# Altium footprint library DipComponent.PcbLib: 303 footprints (part 3 of 19)
Each footprint in its own frame and in the unit in brackets; x right, y up, seen from the top. Pads: shape width x height; smd on the part's side, far side on the other; paste and mask are expansions set on the pad; w line width, h text height; cw(c..) or ccw(c..) is an arc to the next point about the centre after c.
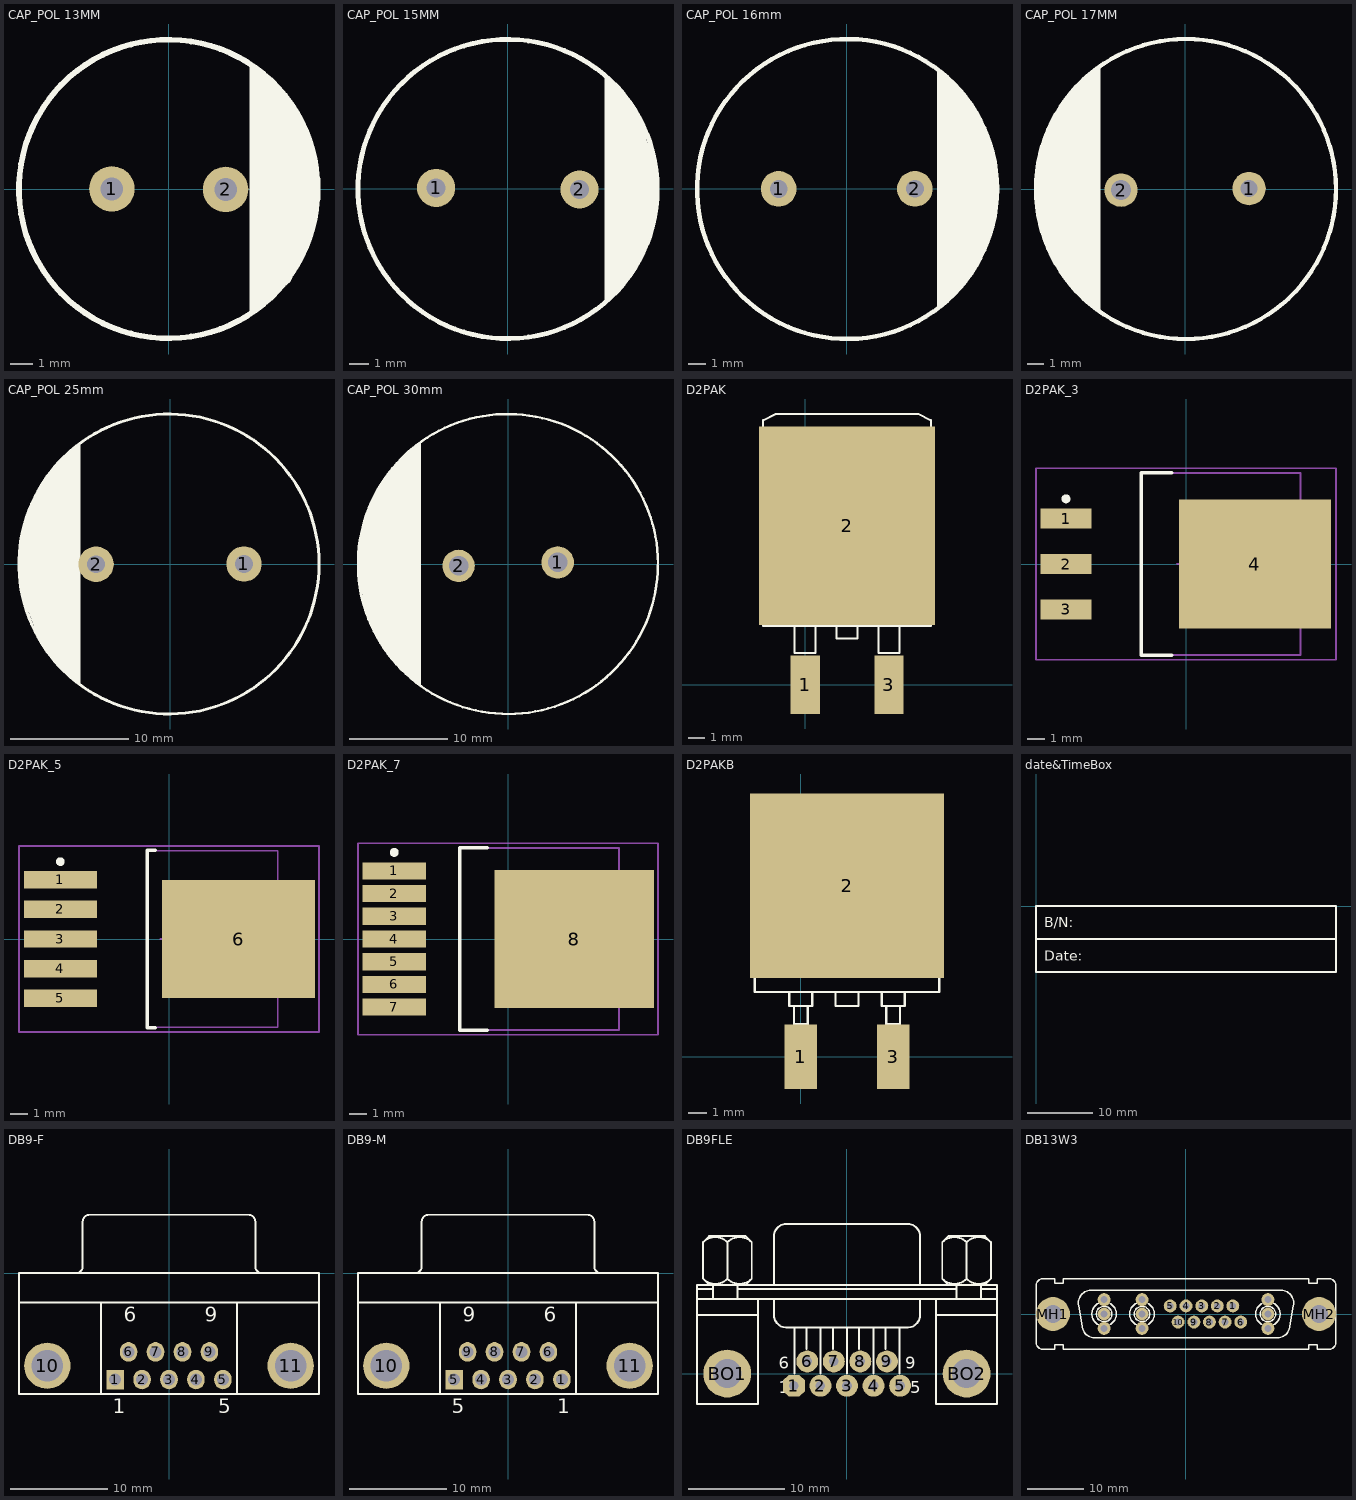
[diagram p2: the footprints below, top view; thin cyan lines are the x and y axes]

## CAP_POL 13MM [mm]
pads (2):
  round 2 hole 1: 1(-2.501,0.013) 2(2.501,-0.013)
Top Overlay:
  circle w0.254: c-0.017,0.007 r6.564
  region: 3.556,-5.588 3.556,5.588 4.572,4.826 5.842,3.048 6.604,0.508 6.35,-1.778 5.334,-4.064 3.81,-5.334
3D body "User Library-Capacitor, Al El, Thru Mt, 2200uF, 25V - CDE #SEK222M025ST.STEP": height 25.4, standoff -28.75, extent -6.6,-6.611 6.6,6.589

## CAP_POL 15MM [mm]
pads (2):
  round 2 hole 1: 1(-3.756,0.041) 2(3.756,-0.041)
Top Overlay:
  circle w0.254: c-0.009,-0.018 r7.845
  region: 5.08,5.842 6.604,4.318 7.62,1.524 7.874,-0.508 7.366,-2.54 6.858,-3.81 5.334,-5.842 5.08,-6.096
3D body "User Library-Cap16x25.STEP": height 25.5, standoff -18.5, extent -7.923,-7.921 8.077,8.079

## CAP_POL 16mm [mm]
pads (2):
  round 2 hole 1: 1(-3.821,-0.001) 2(3.821,0.001)
Top Overlay:
  circle w0.254: c0.011,-0.01 r8.416
  region: 5.08,6.858 5.08,-6.604 6.604,-5.334 7.62,-3.81 8.382,-1.016 8.382,1.524 7.62,3.81 6.35,5.588
3D body "User Library-CE_R300_D650_H1000.STEP": height 26.4, standoff -2.5, extent -8.231,-8.246 8.252,8.215

## CAP_POL 17MM [mm]
pads (2):
  round 2 hole 1: 1(3.83,0.047)
  round 2 hole 1.2: 2(-3.83,-0.047)
Top Overlay:
  circle w0.254: c0.057,0.021 r8.972
  region: -5.08,-7.366 -5.08,7.366 -6.858,5.842 -8.382,3.048 -8.89,0.762 -8.89,-1.016 -8.382,-3.302 -7.112,-5.334
3D body "User Library-Body_R300_D720_H620.STEP": height 16, standoff -2, extent -9.096,-8.931 8.904,9.032

## CAP_POL 25mm [mm]
pads (2):
  round 3 hole 1.5: 1(6.261,0.013) 2(-6.261,-0.013)
Top Overlay:
  circle w0.254: c-0.088,0.01 r12.702
  region: -7.62,-10.16 -7.62,10.16 -9.652,8.382 -11.684,5.334 -12.7,2.032 -12.7,-0.762 -12.446,-2.794 -11.176,-6.096 -9.906,-8.128 -8.382,-9.652
3D body "User Library-Cap 25x50.STEP": height 52, standoff -17, extent -12.506,-12.534 12.494,12.466

## CAP_POL 30mm [mm]
pads (2):
  round 3.3 hole 2: 1(5.047,0.175) 2(-5.047,-0.175)
Top Overlay:
  region: -8.89,12.446 -8.89,-12.446 -10.922,-10.668 -12.954,-8.128 -14.478,-5.08 -15.24,-1.016 -15.24,1.778 -14.224,5.842 -12.107,9.37 -10.245,11.543
  lines w0.254: 15.267,-0.132 cw(c-0.017,0.013) 15.267,0.097
3D body "User Library-Assy_CE_R400_D1200_H1450.STEP": height 36.83, standoff -6.89, extent -15.1,-15.193 15.38,15.28

## D2PAK [mil]
pads (3):
  rect 70x140 smd: 1(0,0) 3(200,0)
  rect 420x472.44 smd: 2(99.91,378.74)
Top Overlay:
  lines w5: -25,140 -25,75 25,75 25,140 ; 75,140 75,110 125,110 125,140 ; 175,140 175,75 225,75 225,140 ; -100,140 -100,600 ; -100,140 300,140 ; -100,140 -90,150 ; -100,600 -100,630 -70,645 270,645 300,630 300,600 ; -100,600 300,600 ; -100,600 -90,575 ; -90,150 -90,575 ; -90,150 290,150 ; -90,575 290,575 ; 290,150 290,575 ; 290,150 300,140 ; 290,575 300,600 ; 300,140 300,600
3D body "D2PAK.STEP": height 184.65, standoff -2.52, extent -100,-9.78 300,555.57

## D2PAK_3 [mm] "D2-PAK, 4-Pads, Body 8.9x10.2mm (max), IPC Medium Density"
height 4.5
pads (4):
  rect 2.85x1.1 smd: 1(-6.7,2.54) 2(-6.7,0) 3(-6.7,-2.54)
  rect 8.5x7.2 smd: 4(3.85,0)
Top Overlay:
  circle w0.25: c-6.7,3.64 r0.125
  lines w0.2: -0.8,-5.1 -2.5,-5.1 -2.5,5.1 -0.8,5.1
Mechanical 13:
  lines w0.1: -2.5,-5.075 6.39,-5.075 6.39,5.075 -2.5,5.075 -2.5,-5.075
Mechanical 15:
  lines w0.1: -0.5,0 0.5,0 ; 0,-0.5 0,0.5 ; -8.375,-5.35 8.375,-5.35 8.375,5.35 -8.375,5.35 -8.375,-5.35
3D body "SW3dPS-TO263-3.STEP": height 4.78, standoff -0.02, extent -7.835,-4.996 7.835,5.004

## D2PAK_5 [mm] "D2-PAK, 6-Pads, Body 7.5x10.2mm (max), IPC Medium Density"
height 4.5
pads (6):
  rect 4.2x1 smd: 1(-6.25,3.4) 2(-6.25,1.7) 3(-6.25,0) 4(-6.25,-1.7) 5(-6.25,-3.4)
  rect 8.8x6.8 smd: 6(4,0)
Top Overlay:
  circle w0.25: c-6.25,4.45 r0.125
  lines w0.2: -0.8,-5.1 -1.25,-5.1 -1.25,5.1 -0.8,5.1
Mechanical 13:
  lines w0.1: -1.25,-5.075 -1.25,5.075 6.25,5.075 6.25,-5.075 -1.25,-5.075
Mechanical 15:
  lines w0.1: -0.5,0 0.5,0 ; 0,-0.5 0,0.5 ; -8.625,-5.35 -8.625,5.35 8.625,5.35 8.625,-5.35 -8.625,-5.35
3D body "SW3dPS-TO263-5.STEP": height 4.78, standoff -0.02, extent -7.745,-5.029 7.925,4.971

## D2PAK_7 [mm] "D2-PAK, 7-Pads, Body 8.9x10.2mm (max), IPC Medium Density"
height 4.5
pads (8):
  rect 3.55x0.95 smd: 1(-6.35,3.81) 2(-6.35,2.54) 3(-6.35,1.27) 4(-6.35,0) 5(-6.35,-1.27) 6(-6.35,-2.54) 7(-6.35,-3.81)
  rect 8.9x7.7 smd: 8(3.7,0)
Top Overlay:
  circle w0.25: c-6.35,4.835 r0.125
  lines w0.2: -1.15,-5.1 -2.7,-5.1 -2.7,5.1 -1.15,5.1
Mechanical 13:
  lines w0.1: -2.7,-5.075 6.19,-5.075 6.19,5.075 -2.7,5.075 -2.7,-5.075
Mechanical 15:
  lines w0.1: -0.5,0 0.5,0 ; 0,-0.5 0,0.5 ; -8.375,-5.35 8.375,-5.35 8.375,5.35 -8.375,5.35 -8.375,-5.35
3D body "SW3dPS-TO263-7.STEP": height 4.56, standoff -0.01, extent -7.005,-5.105 7.361,5.055

## D2PAKB [mil]
pads (3):
  rect 70x140 smd: 1(0,0) 3(200,0)
  rect 420x400 smd: 2(100,370)
Top Overlay:
  lines w5: -25,140 -25,110 25,110 25,140 ; -15,110 -15,70 15,70 15,110 ; 75,140 75,110 125,110 125,140 ; 175,140 175,110 225,110 225,140 ; 185,110 185,70 215,70 215,110 ; -100,140 300,140 300,520 300,550 270,565 -70,565 -100,550 -100,520 -100,140

## date&TimeBox [mil]
Top Overlay:
  lines w10: 0,-196.85 1791.34,-196.85 ; 0,-393.7 1791.34,-393.7 1791.34,0 0,0 0,-393.7
  text "Date:" at 49,-326 h60
  text "B/N:" at 49,-126 h60

## DB9-F [mm] "Connector; D Subminiature; 9 Position; Right Angle; Pitch 1.385 mm"
height 12.75
pads (11):
  rect 1.8x2 hole 1.2: 1(-5.54,-10.92)
  oval 1.8x2 hole 1.2: 2(-2.77,-10.92) 3(0,-10.92) 4(2.77,-10.92) 5(5.54,-10.92) 6(-4.155,-8.08) 7(-1.385,-8.08) 8(1.385,-8.08) 9(4.155,-8.08)
  round 4.76 hole 3.26: 10(-12.495,-9.5) 11(12.495,-9.5)
Top Overlay:
  lines w0.2: -15.4,-3 15.4,-3 ; -9.56,0.005 ccw(c-9.56,0.7) -8.865,0.7 -8.865,5.3 ; -8.86,5.305 cw(c-8.165,5.305) -8.165,6 8.165,6 cw(c8.165,5.305) 8.86,5.305 ; -7,-12.4 -7,-3 ; 7,-12.4 7,-3 ; 8.865,5.3 8.865,0.7 ccw(c9.56,0.7) 9.56,0.005 ; -15.4,-12.4 -15.4,0 15.4,0 15.4,-12.4 -15.4,-12.4
  text "1" at -5.79,-14.375 h1.5
  text "5" at 5.04,-14.375 h1.5
  text "9" at 3.655,-4.975 h1.5
  text "6" at -4.655,-4.975 h1.5
3D body "DB9-f.step": height 12.57, standoff -4.3, extent -15.456,-12.424 15.354,5.876

## DB9-M [mm] "Connector; D Subminiature; 9 Position; Right Angle; Pitch 1.385 mm"
height 12.75
pads (11):
  oval 1.8x2 hole 1.2: 1(5.54,-10.92) 2(2.77,-10.92) 3(0,-10.92) 4(-2.77,-10.92) 6(4.155,-8.08) 7(1.385,-8.08) 8(-1.385,-8.08) 9(-4.155,-8.08)
  rect 1.8x2 hole 1.2: 5(-5.54,-10.92)
  round 4.76 hole 3.26: 10(-12.495,-9.5) 11(12.495,-9.5)
Top Overlay:
  lines w0.2: -15.4,-3 15.4,-3 ; -9.56,0.005 ccw(c-9.56,0.7) -8.865,0.7 -8.865,5.3 ; -8.86,5.305 cw(c-8.165,5.305) -8.165,6 8.165,6 cw(c8.165,5.305) 8.86,5.305 ; -7,-12.4 -7,-3 ; 7,-12.4 7,-3 ; 8.865,5.3 8.865,0.7 ccw(c9.56,0.7) 9.56,0.005 ; -15.4,-12.4 15.4,-12.4 15.4,0 -15.4,0 -15.4,-12.4
  text "9" at -4.655,-4.975 h1.5
  text "6" at 3.655,-4.975 h1.5
  text "1" at 5.04,-14.375 h1.5
  text "5" at -5.79,-14.375 h1.5
3D body "User Library-CON-233_DB9.STEP": height 12.57, standoff -3.86, extent -15.334,-12.433 15.466,5.967

## DB9FLE [mil]
pads (11):
  oct 90x90 hole 39.37: 1(-217.92,-50)
  round 90 hole 39.37: 2(-108.75,-50) 3(0.42,-50) 4(109.58,-50) 5(218.75,-50) 6(-162.92,50) 7(-53.75,50) 8(55.42,50) 9(164.58,50)
  round 196.67 hole 118.33: BO1(-492.08,0) BO2(492.08,0)
Top Overlay:
  lines w8: -616.25,240 -366.25,240 ; -616.25,306.67 617.08,306.67 ; -616.25,348.33 -549.58,348.33 ; -591.34,389.91 ccw(c-541.25,440) -491.16,389.91 ; -591.34,540.09 cw(c-541.25,490) -491.16,540.09 ; -566.25,365 -591.25,390 -591.25,540 -566.25,565 -416.25,565 -391.25,540 -391.25,390 -416.25,365 ; -549.58,306.67 -549.58,365 ; -491.34,389.91 ccw(c-441.25,440) -391.16,389.91 ; -491.34,540.09 cw(c-441.25,490) -391.16,540.09 ; -491.25,390 -491.25,540 ; -449.58,306.67 -449.58,365 ; -449.58,348.33 450.42,348.33 ; -366.25,306.67 -366.25,-125 -616.25,-125 -616.25,365 617.08,365 617.08,-125 367.08,-125 367.08,306.67 ; -299.58,306.67 -299.58,240 ccw(c-249.58,240) -249.58,190 250.42,190 ccw(c250.42,240) 300.42,240 300.42,306.67 ; -299.58,365 -299.58,565 cw(c-249.58,565) -249.58,615 250.42,615 cw(c250.42,565) 300.42,565 300.42,365 ; -216.25,0 -216.25,190 ; -166.25,100 -166.25,190 ; -107.92,0 -107.92,190 ; -57.92,100 -57.92,190 ; 0.42,0 0.42,190 ; 50.42,100 50.42,190 ; 108.75,0 108.75,190 ; 158.75,100 158.75,190 ; 217.08,0 217.08,190 ; 367.08,240 617.08,240 ; 392,389.91 ccw(c442.08,440) 492.17,389.91 ; 392,540.09 cw(c442.08,490) 492.17,540.09 ; 417.08,365 392.08,390 392.08,540 417.08,565 567.08,565 592.08,540 592.08,390 567.08,365 ; 450.42,306.67 450.42,365 ; 492,389.91 ccw(c542.08,440) 592.17,389.91 ; 492,540.09 cw(c542.08,490) 592.17,540.09 ; 492.08,390 492.08,540 ; 550.42,306.67 550.42,365 ; 550.42,348.33 617.08,348.33
  text "9" at 240.42,20 h50
  text "5" at 260.42,-80 h50
  text "1" at -279.58,-80 h50
  text "6" at -279.58,20 h50
3D body "User Library-CON-233_DB9.STEP": height 494.69, standoff -151.96, extent -603.19,-118.63 609.4,605.78

## DB13W3 [mil]
pads (21):
  round 90 hole 47.24: 1(326,56) 2(218,56) 3(110,56) 4(0,56) 5(-110,56) 6(381,-56) 7(272,-56) 8(163,-56) 9(55,-56) 10(-55,-56) A1_1(570,0) A1_2(570,100) A1_3(570,-100) A2_1(-306,0) A2_2(-306,100) A2_3(-306,-100) A3_1(-570,0) A3_2(-570,100) A3_3(-570,-100)
  round 236.22 hole 125.98: MH1(-925.98,0) MH2(925.98,0)
Top Overlay:
  circle w10: c-306,0 r53.85
  circle w10: c570,0 r53.85
  circle w10: c-570,0 r53.85
  lines w10: -723.35,-82.56 ccw(c-635.45,-77.11) -630,-165 630,-165 ccw(c635.45,-77.11) 723.35,-82.56 ; -720,-105 -747.94,56.89 cw(c-657.42,74.48) -675,165 675,165 cw(c657.42,74.48) 747.94,56.89 720,-105 ; -608.08,-76.16 cw(c-570,0) -608.08,76.16 ; -531.92,-76.16 ccw(c-570,0) -531.92,76.16 ; -344.08,-76.16 cw(c-306,0) -344.08,76.16 ; -267.92,-76.16 ccw(c-306,0) -267.92,76.16 ; 531.92,-76.16 cw(c570,0) 531.92,76.16 ; 608.08,-76.16 ccw(c570,0) 608.08,76.16 ; -1044,-196 ccw(c-993,-196) -993,-247 -915,-247 -915,-215 -855,-215 -855,-247 855,-247 855,-215 915,-215 915,-247 993,-247 ccw(c993,-196) 1044,-196 1044,196 ccw(c993,196) 993,247 915,247 915,215 855,215 855,247 -855,247 -855,215 -915,215 -915,247 -993,247 ccw(c-993,196) -1044,196 -1044,-196